# Altium footprint library ICs And Semiconductors SMD.PcbLib: 943 footprints (part 37 of 60)
Each footprint in its own frame and in the unit in brackets; x right, y up, seen from the top. Pads: shape width x height; smd on the part's side, far side on the other; paste and mask are expansions set on the pad; w line width, h text height; cw(c..) or ccw(c..) is an arc to the next point about the centre after c.
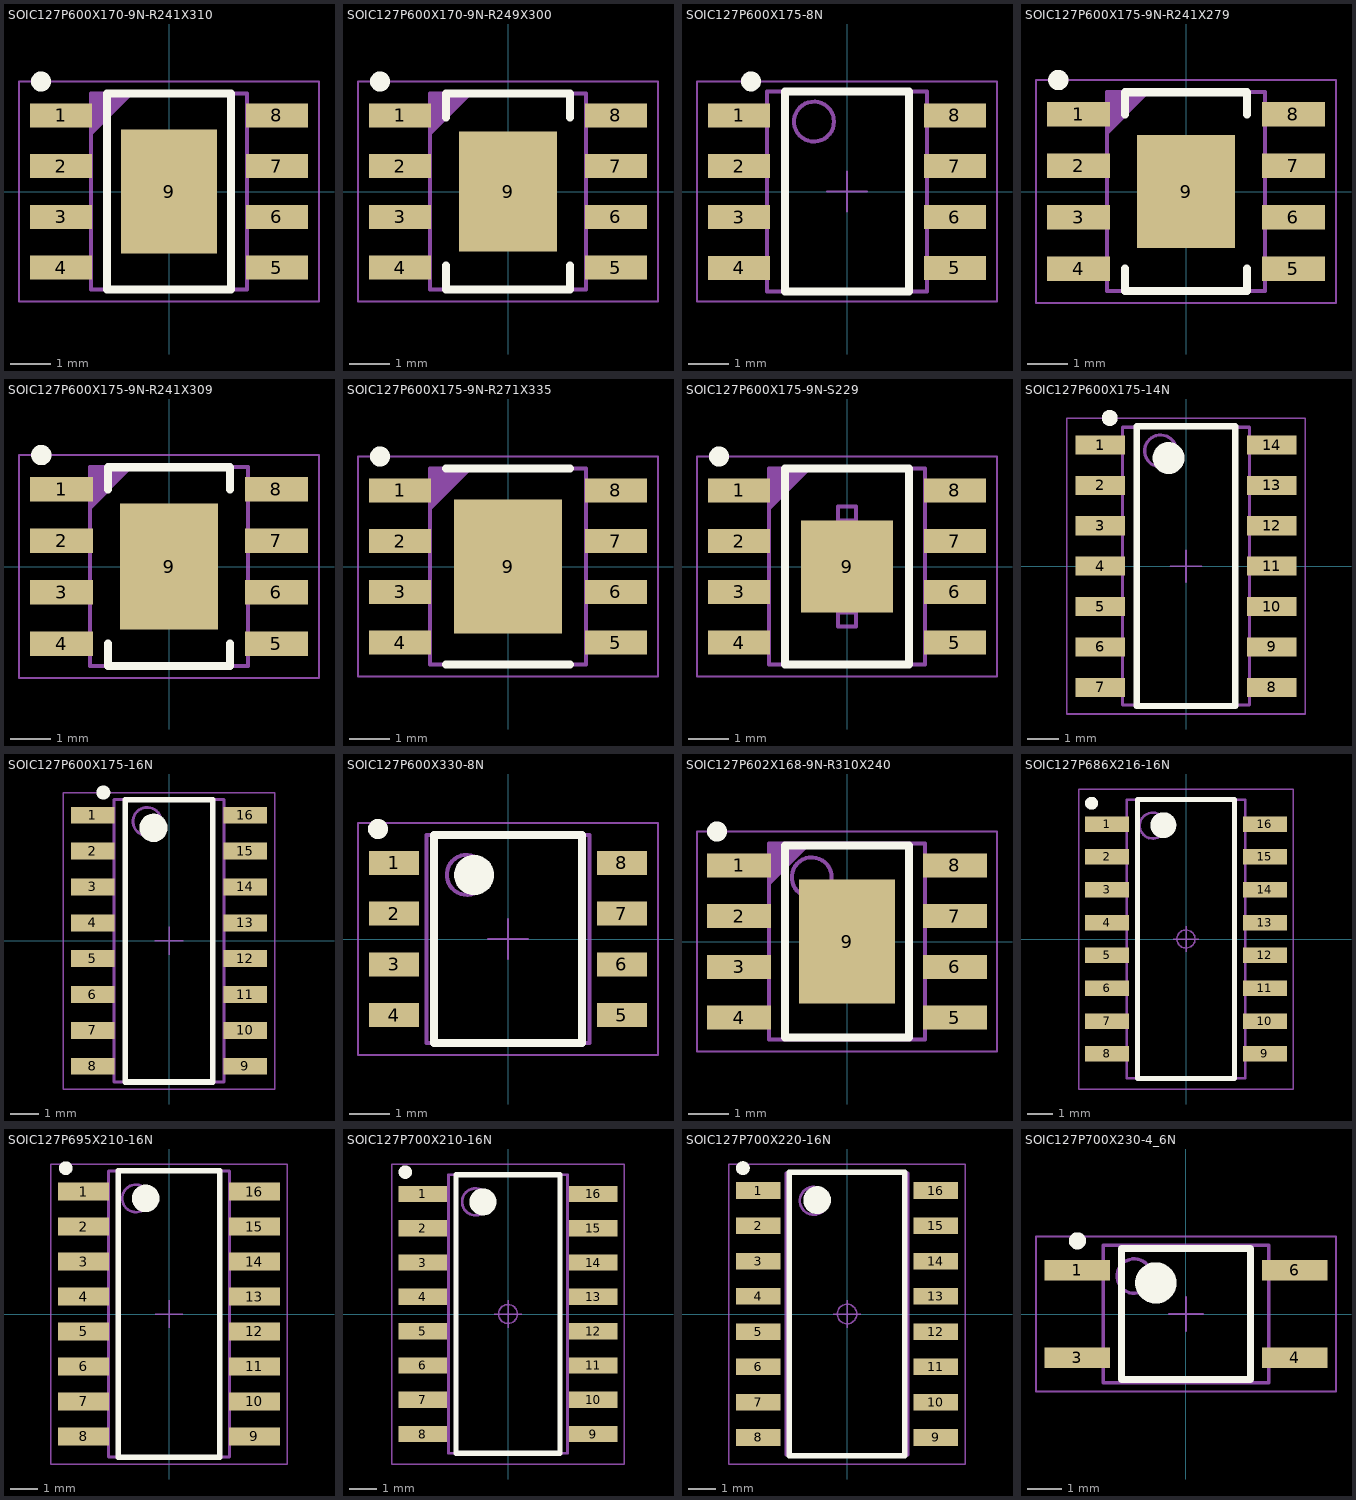
[diagram p36: the footprints below, top view; thin cyan lines are the x and y axes]

## SOIC127P600X170-9N-R241X310 [mm] "SOIC 8, Pitch 1.27mm - Body 4x5mm, (w/Thermal Tab 2.41mm X 3.1mm), IPC Medium Density"
height 1.7
pads (9):
  rect 1.55x0.6 smd: 1(-2.7,1.905) 2(-2.7,0.635) 3(-2.7,-0.635) 4(-2.7,-1.905) 5(2.7,-1.905) 6(2.7,-0.635) 7(2.7,0.635) 8(2.7,1.905)
  rect 2.41x3.1 smd: 9(0,0)
Top Overlay:
  circle w0.25: c-3.2,2.75 r0.125
  lines w0.2: -1.55,-2.45 1.55,-2.45 1.55,2.45 -1.55,2.45 -1.55,-2.45
Mechanical 14:
  lines w0.1: -1.95,1.45 -0.95,2.45 ; -1.95,1.55 -1.05,2.45 ; -1.95,1.65 -1.15,2.45 ; -1.95,1.75 -1.25,2.45 ; -1.95,1.85 -1.35,2.45 ; -1.95,1.95 -1.45,2.45 ; -1.95,2.05 -1.55,2.45 ; -1.95,2.15 -1.65,2.45 ; -1.95,2.25 -1.75,2.45 ; -1.95,2.35 -1.85,2.45 ; -1.95,-2.45 1.95,-2.45 1.95,2.45 -1.95,2.45 -1.95,-2.45
Mechanical 15:
  circle w0.05: c0,0 r0.35
  lines w0.05: -0.5,0 0.5,0 ; 0,-0.5 0,0.5 ; -3.75,-2.75 3.75,-2.75 3.75,2.75 -3.75,2.75 -3.75,-2.75
3D body "SOIC127P600X170-9N-R241X310.stp": height 1.75, standoff 0, extent -3.1,-2.5 3.1,2.5

## SOIC127P600X170-9N-R249X300 [mm] "SOIC 8, Pitch 1.27mm - Body 4x5mm, (w/thermal tab 2.49mm X 3mm), IPC Medium Density"
height 1.7
pads (9):
  rect 1.55x0.6 smd: 1(-2.7,1.905) 2(-2.7,0.635) 3(-2.7,-0.635) 4(-2.7,-1.905) 5(2.7,-1.905) 6(2.7,-0.635) 7(2.7,0.635) 8(2.7,1.905)
  rect 2.45x3 smd: 9(0,0)
Top Overlay:
  circle w0.25: c-3.2,2.75 r0.125
  lines w0.2: -1.55,-1.85 -1.55,-2.45 1.55,-2.45 1.55,-1.85 ; -1.55,1.85 -1.55,2.45 1.55,2.45 1.55,1.85
Mechanical 14:
  lines w0.1: -1.95,1.45 -0.95,2.45 ; -1.95,1.55 -1.05,2.45 ; -1.95,1.65 -1.15,2.45 ; -1.95,1.75 -1.25,2.45 ; -1.95,1.85 -1.35,2.45 ; -1.95,1.95 -1.45,2.45 ; -1.95,2.05 -1.55,2.45 ; -1.95,2.15 -1.65,2.45 ; -1.95,2.25 -1.75,2.45 ; -1.95,2.35 -1.85,2.45 ; -1.95,-2.45 1.95,-2.45 1.95,2.45 -1.95,2.45 -1.95,-2.45
Mechanical 15:
  circle w0.05: c0,0 r0.35
  lines w0.05: -0.5,0 0.5,0 ; 0,-0.5 0,0.5 ; -3.75,-2.75 3.75,-2.75 3.75,2.75 -3.75,2.75 -3.75,-2.75
3D body "SOIC127P600X170-9N-R249X300.stp": height 1.75, standoff 0, extent -3.1,-2.5 3.1,2.5

## SOIC127P600X175-8N [mm] "SOIC 8, Pitch 1.27mm - Body 4x5mm, IPC Medium Density"
height 1.75
pads (8):
  rect 1.55x0.6 smd: 1(-2.7,1.905) 2(-2.7,0.635) 3(-2.7,-0.635) 4(-2.7,-1.905) 5(2.7,-1.905) 6(2.7,-0.635) 7(2.7,0.635) 8(2.7,1.905)
Top Overlay:
  circle w0.25: c-2.4,2.755 r0.125
  lines w0.2: -1.55,-2.5 1.55,-2.5 1.55,2.5 -1.55,2.5 -1.55,-2.5
Mechanical 14:
  circle w0.1: c-0.825,1.75 r0.5
  lines w0.1: -2,-2.5 2,-2.5 2,2.5 -2,2.5 -2,-2.5
Mechanical 15:
  lines w0.05: -0.5,0 0.5,0 ; 0,-0.5 0,0.5 ; -3.75,-2.75 3.75,-2.75 3.75,2.75 -3.75,2.75 -3.75,-2.75
3D body "SOIC127P600X175-8N.stp": height 1.75, standoff 0, extent -3.1,-2.5 3.1,2.5

## SOIC127P600X175-9N-R241X279 [mm] "SOIC 8, Pitch 1.27mm - Body 3.9x4.9mm, (w/thermal tab 2.41mm X 2.79mm), IPC Medium Density"
height 1.75
pads (9):
  rect 1.55x0.6 smd: 1(-2.65,1.905) 2(-2.65,0.635) 3(-2.65,-0.635) 4(-2.65,-1.905) 5(2.65,-1.905) 6(2.65,-0.635) 7(2.65,0.635) 8(2.65,1.905)
  rect 2.41x2.79 smd: 9(0,0)
Top Overlay:
  circle w0.25: c-3.15,2.75 r0.125
  lines w0.2: -1.5,-1.9 -1.5,-2.45 1.5,-2.45 1.5,-1.9 ; -1.5,1.9 -1.5,2.45 1.5,2.45 1.5,1.9
Mechanical 14:
  lines w0.1: -1.95,1.45 -0.95,2.45 ; -1.95,1.55 -1.05,2.45 ; -1.95,1.65 -1.15,2.45 ; -1.95,1.75 -1.25,2.45 ; -1.95,1.85 -1.35,2.45 ; -1.95,1.95 -1.45,2.45 ; -1.95,2.05 -1.55,2.45 ; -1.95,2.15 -1.65,2.45 ; -1.95,2.25 -1.75,2.45 ; -1.95,2.35 -1.85,2.45 ; -1.95,-2.45 -1.95,2.45 1.95,2.45 1.95,-2.45 -1.95,-2.45
Mechanical 15:
  circle w0.05: c0,0 r0.35
  lines w0.05: -0.5,0 0.5,0 ; 0,-0.5 0,0.5 ; -3.7,-2.75 -3.7,2.75 3.7,2.75 3.7,-2.75 -3.7,-2.75
3D body "SOIC127P600X175-9N-R241X279.stp": height 1.75, standoff 0, extent -3.1,-2.5 3.1,2.5

## SOIC127P600X175-9N-R241X309 [mm] "SOIC 8, Pitch 1.27mm - Body 3.9x4.9mm, (w/thermal tab 2.41mm X 3.098mm), IPC Medium Density"
height 1.75
pads (9):
  rect 1.55x0.6 smd: 1(-2.65,1.905) 2(-2.65,0.635) 3(-2.65,-0.635) 4(-2.65,-1.905) 5(2.65,-1.905) 6(2.65,-0.635) 7(2.65,0.635) 8(2.65,1.905)
  rect 2.41x3.098 smd: 9(0,0)
Top Overlay:
  circle w0.25: c-3.15,2.75 r0.125
  lines w0.2: -1.5,-1.9 -1.5,-2.45 1.5,-2.45 1.5,-1.9 ; -1.5,1.9 -1.5,2.45 1.5,2.45 1.5,1.9
Mechanical 14:
  lines w0.1: -1.95,1.45 -0.95,2.45 ; -1.95,1.55 -1.05,2.45 ; -1.95,1.65 -1.15,2.45 ; -1.95,1.75 -1.25,2.45 ; -1.95,1.85 -1.35,2.45 ; -1.95,1.95 -1.45,2.45 ; -1.95,2.05 -1.55,2.45 ; -1.95,2.15 -1.65,2.45 ; -1.95,2.25 -1.75,2.45 ; -1.95,2.35 -1.85,2.45 ; -1.95,-2.45 1.95,-2.45 1.95,2.45 -1.95,2.45 -1.95,-2.45
Mechanical 15:
  circle w0.05: c0,0 r0.35
  lines w0.05: -0.5,0 0.5,0 ; 0,-0.5 0,0.5 ; -3.7,-2.75 3.7,-2.75 3.7,2.75 -3.7,2.75 -3.7,-2.75
3D body "SOIC127P600X175-9N-R241X309.stp": height 1.75, standoff 0, extent -3.1,-2.5 3.1,2.5

## SOIC127P600X175-9N-R271X335 [mm] "SOIC, 1.27mm Pitch; 8 Pin, 3.90mm W X 4.90mm L X 1.75mm H body, (w/thermal tab 2.71mm X 3.35mm), IPC Medium Density"
height 1.75
pads (9):
  rect 1.55x0.6 smd: 1(-2.7,1.905) 2(-2.7,0.635) 3(-2.7,-0.635) 4(-2.7,-1.905) 5(2.7,-1.905) 6(2.7,-0.635) 7(2.7,0.635) 8(2.7,1.905)
  rect 2.7x3.35 smd: 9(0,0)
Top Overlay:
  circle w0.25: c-3.2,2.75 r0.125
  lines w0.2: -1.55,-2.45 1.55,-2.45 ; -1.55,2.45 1.55,2.45
Mechanical 14:
  lines w0.1: -1.95,1.45 -0.95,2.45 ; -1.95,1.55 -1.05,2.45 ; -1.95,1.65 -1.15,2.45 ; -1.95,1.75 -1.25,2.45 ; -1.95,1.85 -1.35,2.45 ; -1.95,1.95 -1.45,2.45 ; -1.95,2.05 -1.55,2.45 ; -1.95,2.15 -1.65,2.45 ; -1.95,2.25 -1.75,2.45 ; -1.95,2.35 -1.85,2.45 ; -1.95,-2.45 -1.95,2.45 1.95,2.45 1.95,-2.45 -1.95,-2.45
Mechanical 15:
  circle w0.05: c0,0 r0.35
  lines w0.05: -0.5,0 0.5,0 ; 0,-0.5 0,0.5 ; -3.75,-2.75 -3.75,2.75 3.75,2.75 3.75,-2.75 -3.75,-2.75
3D body "SOIC127P600X175-9N-R271X335.stp": height 1.75, standoff 0, extent -3.1,-2.5 3.1,2.5

## SOIC127P600X175-9N-S229 [mm] "SOIC 8, Pitch 1.27mm - Body 4x5mm, (w/thermal tab 2.29mm X 2.29mm), IPC Medium Density"
height 1.75
pads (9):
  rect 1.55x0.6 smd: 1(-2.7,1.905) 2(-2.7,0.635) 3(-2.7,-0.635) 4(-2.7,-1.905) 5(2.7,-1.905) 6(2.7,-0.635) 7(2.7,0.635) 8(2.7,1.905)
  rect 2.29x2.29 smd: 9(0,0)
Top Overlay:
  circle w0.25: c-3.2,2.75 r0.125
  lines w0.2: -1.55,-2.45 -1.55,2.45 1.55,2.45 1.55,-2.45 -1.55,-2.45
Mechanical 8:
  lines w0.1: -0.229,-1.5 -0.229,-1.144 0.229,-1.144 0.229,-1.5 -0.229,-1.5 ; -0.229,1.144 -0.229,1.5 0.229,1.5 0.229,1.144 -0.229,1.144
Mechanical 14:
  lines w0.1: -1.95,1.45 -0.95,2.45 ; -1.95,1.55 -1.05,2.45 ; -1.95,1.65 -1.15,2.45 ; -1.95,1.75 -1.25,2.45 ; -1.95,1.85 -1.35,2.45 ; -1.95,1.95 -1.45,2.45 ; -1.95,2.05 -1.55,2.45 ; -1.95,2.15 -1.65,2.45 ; -1.95,2.25 -1.75,2.45 ; -1.95,2.35 -1.85,2.45 ; -1.95,-2.45 -1.95,2.45 1.95,2.45 1.95,-2.45 -1.95,-2.45
Mechanical 15:
  lines w0.05: -0.5,0 0.5,0 ; 0,-0.5 0,0.5 ; -3.75,-2.75 -3.75,2.75 3.75,2.75 3.75,-2.75 -3.75,-2.75
3D body "SOIC127P600X175-9N-S229.stp": height 1.75, standoff 0, extent -3.1,-2.5 3.1,2.5

## SOIC127P600X175-14N [mm] "SOIC 14, Pitch 1.27mm - Body 4x8.75mm, IPC Medium Density"
height 1.75
pads (14):
  rect 1.55x0.6 smd: 1(-2.7,3.81) 2(-2.7,2.54) 3(-2.7,1.27) 4(-2.7,0) 5(-2.7,-1.27) 6(-2.7,-2.54) 7(-2.7,-3.81) 8(2.7,-3.81) 9(2.7,-2.54) 10(2.7,-1.27) 11(2.7,0) 12(2.7,1.27) 13(2.7,2.54) 14(2.7,3.81)
Top Overlay:
  circle w0.5: c-0.55,3.4 r0.25
  circle w0.25: c-2.4,4.66 r0.125
  lines w0.2: -1.55,-4.4 -1.55,4.4 1.55,4.4 1.55,-4.4 -1.55,-4.4
Mechanical 14:
  circle w0.1: c-0.8,3.625 r0.5
  lines w0.1: -2,-4.37 -2,4.37 2,4.37 2,-4.37 -2,-4.37
Mechanical 15:
  lines w0.05: -0.5,0 0.5,0 ; 0,-0.5 0,0.5 ; -3.75,-4.65 -3.75,4.65 3.75,4.65 3.75,-4.65 -3.75,-4.65
3D body "SOIC127P600X175-14N.stp": height 1.75, standoff 0, extent -3.1,-4.375 3.1,4.375

## SOIC127P600X175-16N [mm] "SOIC 16, Pitch 1.27mm - Body 4x10mm, IPC Medium Density"
height 1.75
pads (16):
  rect 1.55x0.6 smd: 1(-2.7,4.445) 2(-2.7,3.175) 3(-2.7,1.905) 4(-2.7,0.635) 5(-2.7,-0.635) 6(-2.7,-1.905) 7(-2.7,-3.175) 8(-2.7,-4.445) 9(2.7,-4.445) 10(2.7,-3.175) 11(2.7,-1.905) 12(2.7,-0.635) 13(2.7,0.635) 14(2.7,1.905) 15(2.7,3.175) 16(2.7,4.445)
Top Overlay:
  circle w0.25: c-2.325,5.25 r0.125
  circle w0.5: c-0.55,4 r0.25
  lines w0.2: -1.55,-5 -1.55,5 1.55,5 1.55,-5 -1.55,-5
Mechanical 14:
  circle w0.1: c-0.775,4.225 r0.5
  lines w0.1: -1.95,-5 1.95,-5 1.95,5 -1.95,5 -1.95,-5
Mechanical 15:
  lines w0.05: -0.5,0 0.5,0 ; 0,-0.5 0,0.5 ; -3.75,-5.25 -3.75,5.25 3.75,5.25 3.75,-5.25 -3.75,-5.25
3D body "SOIC127P600X175-16N.stp": height 1.75, standoff 0, extent -3.1,-5 3.1,5

## SOIC127P600X330-8N [mm] "SOIC, 1.27mm pitch;8  pin, 4.00mm W X 5.00mm L, IPC Medium Density"
height 3.3
pads (8):
  rect 1.25x0.6 smd: 1(-2.85,1.905) 2(-2.85,0.635) 3(-2.85,-0.635) 4(-2.85,-1.905) 5(2.85,-1.905) 6(2.85,-0.635) 7(2.85,0.635) 8(2.85,1.905)
Top Overlay:
  circle w0.25: c-3.25,2.75 r0.125
  circle w0.5: c-0.85,1.6 r0.25
  lines w0.2: -1.85,-2.6 -1.85,2.6 1.85,2.6 1.85,-2.6 -1.85,-2.6
Mechanical 14:
  circle w0.1: c-1.032,1.604 r0.5
  lines w0.1: -2.032,-2.604 -2.032,2.604 2.032,2.604 2.032,-2.604 -2.032,-2.604
Mechanical 15:
  lines w0.05: -0.5,0 0.5,0 ; 0,-0.5 0,0.5 ; -3.75,-2.9 -3.75,2.9 3.75,2.9 3.75,-2.9 -3.75,-2.9
3D body "SOIC127P600X330-8N.stp": height 3.3, standoff 0, extent -3,-2.6 3,2.6

## SOIC127P602X168-9N-R310X240 [mm] "SOIC,1.27mm,pitch;8 pin,3.905mm W X 4.895mm L X 1.68mm H body (w/thermal tab 3.1mm X 2.4mm), IPC Medium Density"
height 1.68
pads (9):
  rect 1.6x0.6 smd: 1(-2.7,1.905) 2(-2.7,0.635) 3(-2.7,-0.635) 4(-2.7,-1.905) 5(2.7,-1.905) 6(2.7,-0.635) 7(2.7,0.635) 8(2.7,1.905)
  rect 2.4x3.1 smd: 9(0,0)
Top Overlay:
  circle w0.25: c-3.25,2.75 r0.125
  lines w0.2: -1.55,-2.4 -1.55,2.4 1.55,2.4 1.55,-2.4 -1.55,-2.4
Mechanical 14:
  circle w0.1: c-0.882,1.604 r0.5
  lines w0.1: -1.953,1.447 -0.952,2.448 ; -1.953,1.547 -1.052,2.448 ; -1.953,1.647 -1.152,2.448 ; -1.953,1.847 -1.352,2.448 ; -1.953,2.047 -1.552,2.448 ; -1.953,2.148 -1.652,2.448 ; -1.953,2.347 -1.852,2.448 ; -1.952,1.747 -1.252,2.448 ; -1.952,1.947 -1.452,2.448 ; -1.952,2.247 -1.752,2.448 ; -1.952,-2.448 -1.952,2.448 1.952,2.448 1.952,-2.448 -1.952,-2.448
Mechanical 15:
  lines w0.05: -0.5,0 0.5,0 ; 0,-0.5 0,0.5 ; -3.75,-2.75 -3.75,2.75 3.75,2.75 3.75,-2.75 -3.75,-2.75
3D body "SOIC127P602X168-9N-R310X240.stp": height 1.68, standoff 0, extent -3.1,-2.5 3.1,2.5

## SOIC127P686X216-16N [mm] "SOIC, 1.27mm Pitch; 16 Pin, 4.575mm W X 10.77mm L X 2.16mm H Body, IPC Medium Density"
height 2.16
pads (16):
  rect 1.7x0.6 smd: 1(-3.05,4.445) 2(-3.05,3.175) 3(-3.05,1.905) 4(-3.05,0.635) 5(-3.05,-0.635) 6(-3.05,-1.905) 7(-3.05,-3.175) 8(-3.05,-4.445) 9(3.05,-4.445) 10(3.05,-3.175) 11(3.05,-1.905) 12(3.05,-0.635) 13(3.05,0.635) 14(3.05,1.905) 15(3.05,3.175) 16(3.05,4.445)
Top Overlay:
  circle w0.25: c-3.65,5.25 r0.125
  circle w0.5: c-0.875,4.4 r0.25
  lines w0.2: -1.875,-5.4 -1.875,5.4 1.875,5.4 1.875,-5.4 -1.875,-5.4
Mechanical 14:
  circle w0.1: c-1.288,4.385 r0.5
  lines w0.1: -2.288,-5.385 -2.288,5.385 2.288,5.385 2.288,-5.385 -2.288,-5.385
Mechanical 15:
  circle w0.05: c0,0 r0.35
  lines w0.05: -0.5,0 0.5,0 ; 0,-0.5 0,0.5 ; -4.15,-5.8 -4.15,5.8 4.15,5.8 4.15,-5.8 -4.15,-5.8
3D body "SOIC127P686X216-16N.stp": height 2.16, standoff 0, extent -3.555,-5.51 3.555,5.51

## SOIC127P695X210-16N [mm] "SOIC, 16-Leads, Body 10.4x4.6mm (max), Pitch 1.27mm, IPC Medium Density"
height 2.1
pads (16):
  rect 1.85x0.65 smd: 1(-3.1,4.445) 2(-3.1,3.175) 3(-3.1,1.905) 4(-3.1,0.635) 5(-3.1,-0.635) 6(-3.1,-1.905) 7(-3.1,-3.175) 8(-3.1,-4.445) 9(3.1,-4.445) 10(3.1,-3.175) 11(3.1,-1.905) 12(3.1,-0.635) 13(3.1,0.635) 14(3.1,1.905) 15(3.1,3.175) 16(3.1,4.445)
Top Overlay:
  circle w0.5: c-0.85,4.2 r0.25
  circle w0.25: c-3.75,5.3 r0.125
  lines w0.2: -1.85,-5.2 1.85,-5.2 1.85,5.2 -1.85,5.2 -1.85,-5.2
Mechanical 14:
  circle w0.1: c-1.2,4.2 r0.5
  lines w0.1: -2.2,-5.2 2.2,-5.2 2.2,5.2 -2.2,5.2 -2.2,-5.2
Mechanical 15:
  lines w0.05: -0.5,0 0.5,0 ; 0,-0.5 0,0.5 ; -4.3,-5.45 4.3,-5.45 4.3,5.45 -4.3,5.45 -4.3,-5.45
3D body "SOIC127P695X210-16N.stp": height 2.1, standoff 0, extent -3.68,-5.2 3.681,5.2

## SOIC127P700X210-16N [mm] "SOIC, 1.27mm Pitch; 16 Pin, 4.40mm W X 10.30mm L X 2.10mm H Body, IPC Medium Density"
height 2.1
pads (16):
  rect 1.8x0.6 smd: 1(-3.15,4.445) 2(-3.15,3.175) 3(-3.15,1.905) 4(-3.15,0.635) 5(-3.15,-0.635) 6(-3.15,-1.905) 7(-3.15,-3.175) 8(-3.15,-4.445) 9(3.15,-4.445) 10(3.15,-3.175) 11(3.15,-1.905) 12(3.15,-0.635) 13(3.15,0.635) 14(3.15,1.905) 15(3.15,3.175) 16(3.15,4.445)
Top Overlay:
  circle w0.5: c-0.925,4.15 r0.25
  circle w0.25: c-3.8,5.25 r0.125
  lines w0.2: -1.925,-5.15 -1.925,5.15 1.925,5.15 1.925,-5.15 -1.925,-5.15
Mechanical 14:
  circle w0.1: c-1.2,4.15 r0.5
  lines w0.1: -2.2,-5.15 -2.2,5.15 2.2,5.15 2.2,-5.15 -2.2,-5.15
Mechanical 15:
  circle w0.05: c0,0 r0.35
  lines w0.05: -0.5,0 0.5,0 ; 0,-0.5 0,0.5 ; -4.3,-5.55 -4.3,5.55 4.3,5.55 4.3,-5.55 -4.3,-5.55
3D body "SOIC127P700X210-16N.stp": height 2.1, standoff 0, extent -3.53,-5.275 3.531,5.275

## SOIC127P700X220-16N [mm] "SOIC, 1.27mm Pitch; 16 Pin,4.40mm W X 10.15mm L X 2.20mm H Body, IPC Medium Density"
height 2.2
pads (16):
  rect 1.6x0.6 smd: 1(-3.2,4.445) 2(-3.2,3.175) 3(-3.2,1.905) 4(-3.2,0.635) 5(-3.2,-0.635) 6(-3.2,-1.905) 7(-3.2,-3.175) 8(-3.2,-4.445) 9(3.2,-4.445) 10(3.2,-3.175) 11(3.2,-1.905) 12(3.2,-0.635) 13(3.2,0.635) 14(3.2,1.905) 15(3.2,3.175) 16(3.2,4.445)
Top Overlay:
  circle w0.5: c-1.075,4.1 r0.25
  circle w0.25: c-3.75,5.25 r0.125
  lines w0.2: -2.075,-5.1 2.075,-5.1 2.075,5.1 -2.075,5.1 -2.075,-5.1
Mechanical 14:
  circle w0.1: c-1.2,4.075 r0.5
  lines w0.1: -2.2,-5.075 2.2,-5.075 2.2,5.075 -2.2,5.075 -2.2,-5.075
Mechanical 15:
  circle w0.05: c0,0 r0.35
  lines w0.05: -0.5,0 0.5,0 ; 0,-0.5 0,0.5 ; -4.25,-5.4 4.25,-5.4 4.25,5.4 -4.25,5.4 -4.25,-5.4
3D body "SOIC127P700X220-16N.stp": height 2.2, standoff 0, extent -3.53,-5.275 3.531,5.275

## SOIC127P700X230-4_6N [mm] "SOIC,1.27mm Pitch; 4 pin, 4.60mm W X 3.75mm L X 2.30mm H Body, IPC Medium Density"
height 2.3
pads (4):
  rect 1.9x0.6 smd: 1(-3.15,1.27) 3(-3.15,-1.27) 4(3.15,-1.27) 6(3.15,1.27)
Top Overlay:
  circle w0.25: c-3.15,2.12 r0.125
  circle w0.6: c-0.875,0.9 r0.3
  lines w0.2: -1.875,-1.9 -1.875,1.9 1.875,1.9 1.875,-1.9 -1.875,-1.9
Mechanical 14:
  circle w0.1: c-1.5,1.1 r0.5
  lines w0.1: -2.4,-2 -2.4,2 2.4,2 2.4,-2 -2.4,-2
Mechanical 15:
  lines w0.05: -0.5,0 0.5,0 ; 0,-0.5 0,0.5 ; -4.35,-2.25 -4.35,2.25 4.35,2.25 4.35,-2.25 -4.35,-2.25
3D body "SOIC127P700X230-4_6N.stp": height 2.3, standoff 0, extent -3.7,-1.975 3.7,1.975